# Altium integrated library Supp-Lib.IntLib: 86 symbols (continued)
## SM10B-GHS-TB(LF)(SN) (continued)
GH Disconnectable Crimp Style Connector, Pitch 1.25 mm, 1 x 10 Position, Height 4.25 mm, -25 to 85 degC, RoHS, Tape and Reel; Manufacturer: JST; No of Positions: 10; Pitch: 1.25mm; Style/Orientation: RightAngleHeader/Plug; Package Reference: SM10B-GHS-TB; Type: WiretoBoard; Datasheet URL: http://www.jst-mfg.com/product/pdf/eng/eGH.pdf; Termination: Crimp; Manufacturer URL: http://www.jst.com/home2.html; Mounting Technology: SurfaceMount; Datasheet Version: 05/2016; Package Description: GH Disconnectable Crimp Style Connector, Pitch 1.25 mm, 1 x 10 Position, Height 4.25 mm
footprint JST-SM10B-GHS-TB_V (SMD, 10-Leads, Body 15.75x4.05mm, Pitch 1.25mm)
pins: 1, 2, 3, 4, 5, 6, 7, 8, 9, 10, MP1, MP2

## SM11B-GHS-TB(LF)(SN)
designator P?
GH Disconnectable Crimp Style Connector, Pitch 1.25 mm, 1 x 11 Position, Height 4.25 mm, -25 to 85 degC, RoHS, Tape and Reel; Manufacturer: JST; No of Positions: 11; Pitch: 1.25mm; Style/Orientation: RightAngleHeader/Plug; Package Reference: SM11B-GHS-TB; Type: WiretoBoard; Datasheet URL: http://www.jst-mfg.com/product/pdf/eng/eGH.pdf; Termination: Crimp; Manufacturer URL: http://www.jst.com/home2.html; Mounting Technology: SurfaceMount; Datasheet Version: 05/2016; Package Description: GH Disconnectable Crimp Style Connector, Pitch 1.25 mm, 1 x 11 Position, Height 4.25 mm
footprint JST-SM11B-GHS-TB_V (SMD, 11-Leads, Body 17.00x4.05mm, Pitch 1.25mm)
pins: 1, 2, 3, 4, 5, 6, 7, 8, 9, 10, 11, MP1, MP2

## SM12B-GHS-TB(LF)(SN)
designator P?
GH Disconnectable Crimp Style Connector, Pitch 1.25 mm, 1 x 12 Position, Height 4.25 mm, -25 to 85 degC, RoHS, Tape and Reel; Manufacturer: JST; No of Positions: 12; Pitch: 1.25mm; Style/Orientation: RightAngleHeader/Plug; Package Reference: SM12B-GHS-TB; Type: WiretoBoard; Datasheet URL: http://www.jst-mfg.com/product/pdf/eng/eGH.pdf; Termination: Crimp; Manufacturer URL: http://www.jst.com/home2.html; Mounting Technology: SurfaceMount; Datasheet Version: 05/2016; Package Description: GH Disconnectable Crimp Style Connector, Pitch 1.25 mm, 1 x 12 Position, Height 4.25 mm
footprint JST-SM12B-GHS-TB_V (SMD, 12-Leads, Body 18.25x4.05mm, Pitch 1.25mm)
pins: 1, 2, 3, 4, 5, 6, 7, 8, 9, 10, 11, 12, MP1, MP2

## SM13B-GHS-TB(LF)(SN)
designator P?
GH Disconnectable Crimp Style Connector, Pitch 1.25 mm, 1 x 13 Position, Height 4.25 mm, -25 to 85 degC, RoHS, Tape and Reel; Manufacturer: JST; No of Positions: 13; Pitch: 1.25mm; Style/Orientation: RightAngleHeader/Plug; Package Reference: SM13B-GHS-TB; Type: WiretoBoard; Datasheet URL: http://www.jst-mfg.com/product/pdf/eng/eGH.pdf; Termination: Crimp; Manufacturer URL: http://www.jst.com/home2.html; Mounting Technology: SurfaceMount; Datasheet Version: 05/2016; Package Description: GH Disconnectable Crimp Style Connector, Pitch 1.25 mm, 1 x 13 Position, Height 4.25 mm
footprint JST-SM13B-GHS-TB_V (SMD, 13-Leads, Body 19.50x4.05mm, Pitch 1.25mm)
pins: 1, 2, 3, 4, 5, 6, 7, 8, 9, 10, 11, 12, 13, MP1, MP2

## SM14B-GHS-TB(LF)(SN)
designator P?
GH Disconnectable Crimp Style Connector, Pitch 1.25 mm, 1 x 14 Position, Height 4.25 mm, -25 to 85 degC, RoHS, Tape and Reel; Manufacturer: JST; No of Positions: 14; Pitch: 1.25mm; Style/Orientation: RightAngleHeader/Plug; Package Reference: SM14B-GHS-TB; Type: WiretoBoard; Datasheet URL: http://www.jst-mfg.com/product/pdf/eng/eGH.pdf; Termination: Crimp; Manufacturer URL: http://www.jst.com/home2.html; Mounting Technology: SurfaceMount; Datasheet Version: 05/2016; Package Description: GH Disconnectable Crimp Style Connector, Pitch 1.25 mm, 1 x 14 Position, Height 4.25 mm
footprint JST-SM14B-GHS-TB_V (SMD, 14-Leads, Body 20.75x4.05mm, Pitch 1.25mm)
pins: 1, 2, 3, 4, 5, 6, 7, 8, 9, 10, 11, 12, 13, 14, MP1, MP2

## SM15B-GHS-TB(LF)(SN)
designator P?, comment SM15B-GHS-TBT(LF)(SN)
GH Disconnectable Crimp Style Connector, Pitch 1.25 mm, 1 x 15 Position, Height 4.25 mm, -25 to 85 degC, RoHS, Tape and Reel; Manufacturer: JST; No of Positions: 15; Pitch: 1.25mm; Style/Orientation: RightAngleHeader/Plug; Package Reference: SM15B-GHS-TB; Type: WiretoBoard; Datasheet URL: http://www.jst-mfg.com/product/pdf/eng/eGH.pdf; Termination: Crimp; Manufacturer URL: http://www.jst.com/home2.html; Mounting Technology: SurfaceMount; Datasheet Version: 05/2016; Package Description: GH Disconnectable Crimp Style Connector, Pitch 1.25 mm, 1 x 15 Position, Height 4.25 mm
footprint JST-SM15B-GHS-TB_V (SMD, 15-Leads, Body 22.00x4.05mm, Pitch 1.25mm)
pins: 1, 2, 3, 4, 5, 6, 7, 8, 9, 10, 11, 12, 13, 14, 15, MP1, MP2


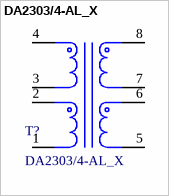
[diagram p8: symbol DA2303/4-AL_X]

## DA2303/4-AL_X
designator T?
SMT Power Transformers
footprint DA2303-AL
pins: 1, 2, 3, 4, 5, 6, 7, 8


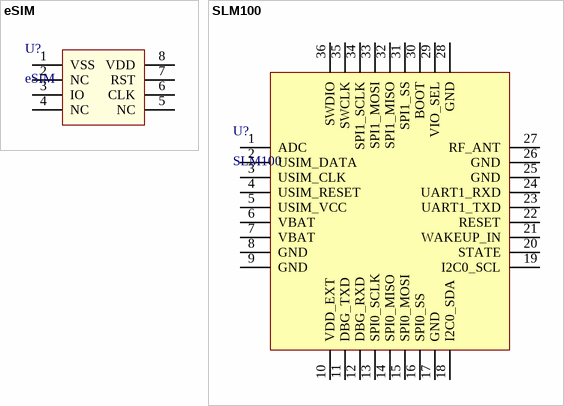
[diagram p9: symbols eSIM to SLM100]

## eSIM
designator U?
中移物联网eSIM 芯片
footprint WSON8_2X2
footprint WSON8_5X6
footprint WSON8_5X6-L
footprint WSON8_5X6-M
pins: 1 VSS, 2 NC, 3 IO, 4 NC, 5 NC, 6 CLK, 7 RST, 8 VDD

## SLM100
designator U?
SLM100 NB-IOT 模块
footprint SLM100
pins: 1 ADC, 2 USIM_DATA, 3 USIM_CLK, 4 USIM_RESET, 5 USIM_VCC, 6 VBAT, 7 VBAT, 8 GND, 9 GND, 10 VDD_EXT, 11 DBG_TXD, 12 DBG_RXD, 13 SPI0_SCLK, 14 SPI0_MISO, 15 SPI0_MOSI, 16 SPI0_SS, 17 GND, 18 I2C0_SDA, 19 I2C0_SCL, 20 STATE, 21 WAKEUP_IN, 22 RESET, 23 UART1_TXD, 24 UART1_RXD, 25 GND, 26 GND, 27 RF_ANT, 28 GND, 29 VIO_SEL, 30 BOOT, 31 SPI1_SS, 32 SPI1_MISO, 33 SPI1_MOSI, 34 SPI1_SCLK, 35 SWCLK, 36 SWDIO


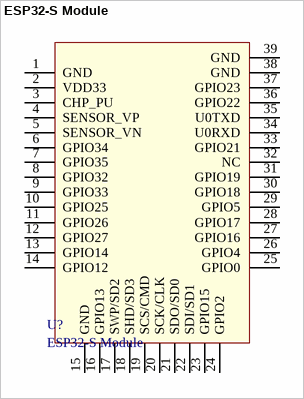
[diagram p10: symbol ESP32-S Module]

## ESP32-S Module
designator U?
通用型 WiFi-BT-BLE MCU 模组
footprint ESP32-S
pins: 1 GND, 2 VDD33, 3 CHP_PU, 4 SENSOR_VP, 5 SENSOR_VN, 6 GPIO34, 7 GPIO35, 8 GPIO32, 9 GPIO33, 10 GPIO25, 11 GPIO26, 12 GPIO27, 13 GPIO14, 14 GPIO12, 15 GND, 16 GPIO13, 17 SWP/SD2, 18 SHD/SD3, 19 SCS/CMD, 20 SCK/CLK, 21 SDO/SD0, 22 SDI/SD1, 23 GPIO15, 24 GPIO2, 25 GPIO0, 26 GPIO4, 27 GPIO16, 28 GPIO17, 29 GPIO5, 30 GPIO18, 31 GPIO19, 32 NC, 33 GPIO21, 34 U0RXD, 35 U0TXD, 36 GPIO22, 37 GPIO23, 38 GND, 39 GND


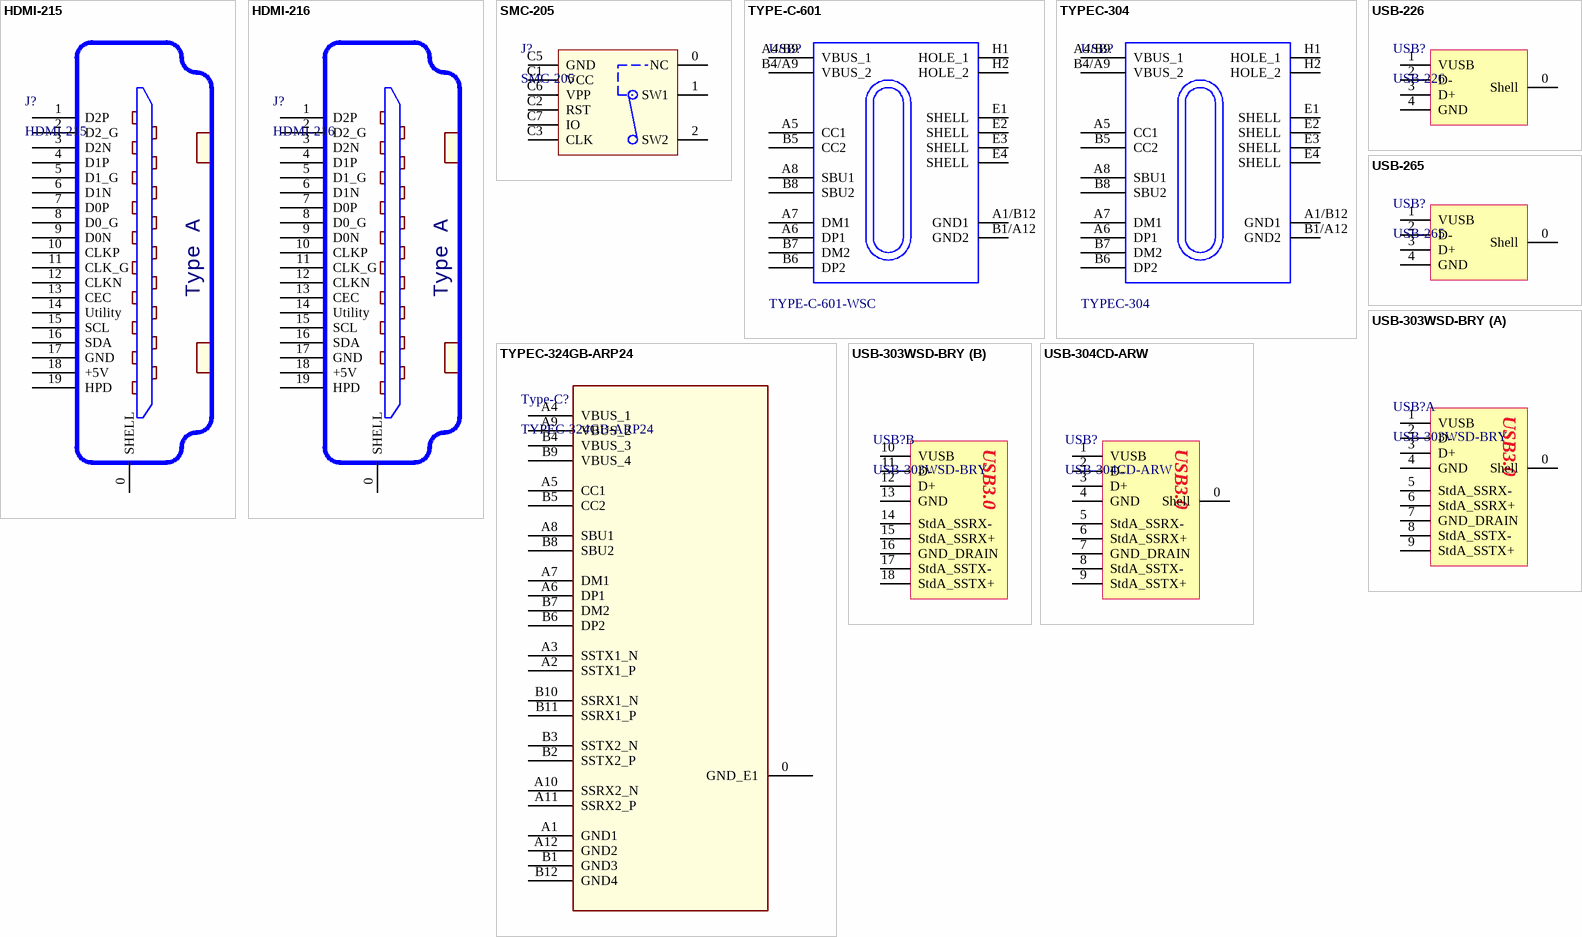
[diagram p11: symbols HDMI-215 to USB-304CD-ARW]

## HDMI-215
designator J?
讯普HDMI-215连接器
footprint HDMI-215
pins: 0 SHELL, 1 D2P, 2 D2_G, 3 D2N, 4 D1P, 5 D1_G, 6 D1N, 7 D0P, 8 D0_G, 9 D0N, 10 CLKP, 11 CLK_G, 12 CLKN, 13 CEC, 14 Utility, 15 SCL, 16 SDA, 17 GND, 18 +5V, 19 HPD
text: Type A

## HDMI-216
designator J?
讯普HDMI-216连接器
footprint HDMI-216
pins: 0 SHELL, 1 D2P, 2 D2_G, 3 D2N, 4 D1P, 5 D1_G, 6 D1N, 7 D0P, 8 D0_G, 9 D0N, 10 CLKP, 11 CLK_G, 12 CLKN, 13 CEC, 14 Utility, 15 SCL, 16 SDA, 17 GND, 18 +5V, 19 HPD
text: Type A

## SMC-205
designator J?
自弹式 带检测PIN MICRO SIM; Revised By: Z_xiao
footprint SMC-205
pins: 0 NC, 1 SW1, 2 SW2, C1 VCC, C2 RST, C3 CLK, C5 GND, C6 VPP, C7 IO

## TYPE-C-601
designator USB?, comment TYPE-C-601-WSC
16PIN(带2.0数据版) 卧式贴片型母座; Value: TYPE-C; 存货编码: 1120102031; 存货名称: 贴装USB座; 规格型号: USB2.0,type-c,母座,单层,横卧,16pin,（两脚为插装）
footprint TYPE-C-601-WSC
footprint TYPE-C-601-WSCL100
pins: A1/B12 GND1, A4/B9 VBUS_1, A5 CC1, A6 DP1, A7 DM1, A8 SBU1, B1/A12 GND2, B4/A9 VBUS_2, B5 CC2, B6 DP2, B7 DM2, B8 SBU2, E1 SHELL, E2 SHELL, E3 SHELL, E4 SHELL, H1 HOLE_1, H2 HOLE_2

## TYPEC-304
designator USB?
16PIN(带2.0数据版) 卧式贴片型母座; Value: TYPE-C; 存货编码: 1120102031; 存货名称: 贴装USB座; 规格型号: USB2.0,type-c,母座,单层,横卧,16pin,（两脚为插装）
footprint TYPEC-304-ACP16
pins: A1/B12 GND1, A4/B9 VBUS_1, A5 CC1, A6 DP1, A7 DM1, A8 SBU1, B1/A12 GND2, B4/A9 VBUS_2, B5 CC2, B6 DP2, B7 DM2, B8 SBU2, E1 SHELL, E2 SHELL, E3 SHELL, E4 SHELL, H1 HOLE_1, H2 HOLE_2

## TYPEC-324GB-ARP24
designator Type-C?
24PIN(全功能版)  母座  卧式 贴片型
footprint TYPEC-324GB-ARP24
pins: 0 GND_E1, A1 GND1, A2 SSTX1_P, A3 SSTX1_N, A4 VBUS_1, A5 CC1, A6 DP1, A7 DM1, A8 SBU1, A9 VBUS_2, A10 SSRX2_N, A11 SSRX2_P, A12 GND2, B1 GND3, B2 SSTX2_P, B3 SSTX2_N, B4 VBUS_3, B5 CC2, B6 DP2, B7 DM2, B8 SBU2, B9 VBUS_4, B10 SSRX1_N, B11 SSRX1_P, B12 GND4

## USB-226
designator USB?
USB2.0 侧立 母座 插脚型
footprint USB-226-BRW
pins: 0 Shell, 1 VUSB, 2 D-, 3 D+, 4 GND

## USB-265
designator USB?
USB2.0 侧立 母座 插脚型
footprint USB-265-BRW
pins: 0 Shell, 1 VUSB, 2 D-, 3 D+, 4 GND

## USB-303WSD-BRY
designator USB?
9pin 双排 卧插 卷边/无卷边 A型母座
footprint USB-303WSD-CRY
footprint USB-303WSD-BRY
footprint USB-303WSD-BRW
part A pins: 0 Shell, 1 VUSB, 2 D-, 3 D+, 4 GND, 5 StdA_SSRX-, 6 StdA_SSRX+, 7 GND_DRAIN, 8 StdA_SSTX-, 9 StdA_SSTX+
part B pins: 10 VUSB, 11 D-, 12 D+, 13 GND, 14 StdA_SSRX-, 15 StdA_SSRX+, 16 GND_DRAIN, 17 StdA_SSTX-, 18 StdA_SSTX+
part A text: USB3.0
part B text: USB3.0

## USB-304CD-ARW
designator USB?
USB3.0 侧立 母座 插脚型
footprint USB-304CD-ARW
pins: 0 Shell, 1 VUSB, 2 D-, 3 D+, 4 GND, 5 StdA_SSRX-, 6 StdA_SSRX+, 7 GND_DRAIN, 8 StdA_SSTX-, 9 StdA_SSTX+
text: USB3.0


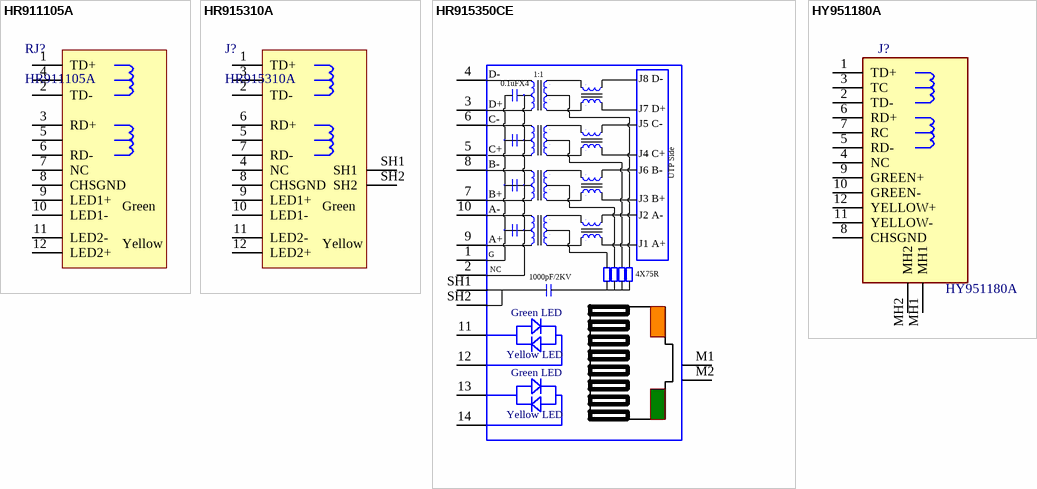
[diagram p12: symbols HR911105A to HY951180A]

## HR911105A
designator RJ?
带灯以太网接口; Revised By: Z_xiao; Datasheet: http://www.hanrun.com/public/upload/down/2020/09-11/cc11be56d66bb63d5f1eeb85492439c0.pdf
footprint HR911105A (网线接口)
pins: 1 TD+, 2 TD-, 3 RD+, 4, 5, 6 RD-, 7 NC, 8 CHSGND, 9 LED1+, 10 LED1-, 11 LED2-, 12 LED2+
text: Green; Yellow

## HR915310A
designator J?
1x1 Port Tab upright RJ45 Connectorwith Integrated Magnetics and LEDfor 10/100Base-TX NIC Applications; Manufacturer_Name: Hanrun Electronics; Description: RJ45Receptacle 1 Shielded Direct Insert WithLED 0~+70 Plugin Ethernet Connectors / Modular Connectors (RJ45 RJ11) ROHS; Datasheet Link: https://www.lcsc.com/datasheet/lcsc_datasheet_2411121057_HANRUN-Zhongshan-HanRun-Elec-HR915310A_C2760326.pdf; Height: 17.15mm; Manufacturer_Part_Number: hr915310a
footprint hr915310a
pins: 1 TD+, 2 TD-, 3, 4 NC, 5, 6 RD+, 7 RD-, 8 CHSGND, 9 LED1+, 10 LED1-, 11 LED2-, 12 LED2+, SH1, SH2
text: Green; Yellow

## HR915350CE
designator HR915350CE
1x1Port Tab-UP RJ45 Connector / with Integrated Magnetics and LED / for 10/100/1000Base-T Applications; Revised By: Z_xiao; ComponentLink1Description: Datasheet; ComponentLink1URL: http://www.hanrun.com/index.php
footprint HR915350CE
pins: 1 GND, 2 NC, 3 D+, 4 D-, 5 C+, 6 C-, 7 B+, 8 B-, 9 A+, 10 A-, 11, 12, 13, 14, M1, M2, SH1, SH2
text: 1:1; 0.1uFX4; J8 D-; J7 D+; J5 C-; J4 C+; J6 B-; UTP Side; J3 B+; J2 A-; J1 A+; G; 1000pF/2KV; 4X75R; Green LED; Yellow LED

## HY951180A
designator J?
1x1 Port Tab upright RJ45 Connector / with Integrated Magnetics and LED / for 10/100Base-TX NIC Applications; Manufacturer_Name: Hanrun Electronics; Datasheet Link: https://datasheet.lcsc.com/szlcsc/Zhongshan-HanRun-Elec-HY951180A_C34677.pdf; Height: 17.5mm; Manufacturer_Part_Number: HY951180A
footprint HY951180A
pins: 1 TD+, 2 TD-, 3 TC, 4 NC, 5 RD-, 6 RD+, 7 RC, 8 CHSGND, 9 GREEN+, 10 GREEN-, 11 YELLOW-, 12 YELLOW+, MH1, MH2


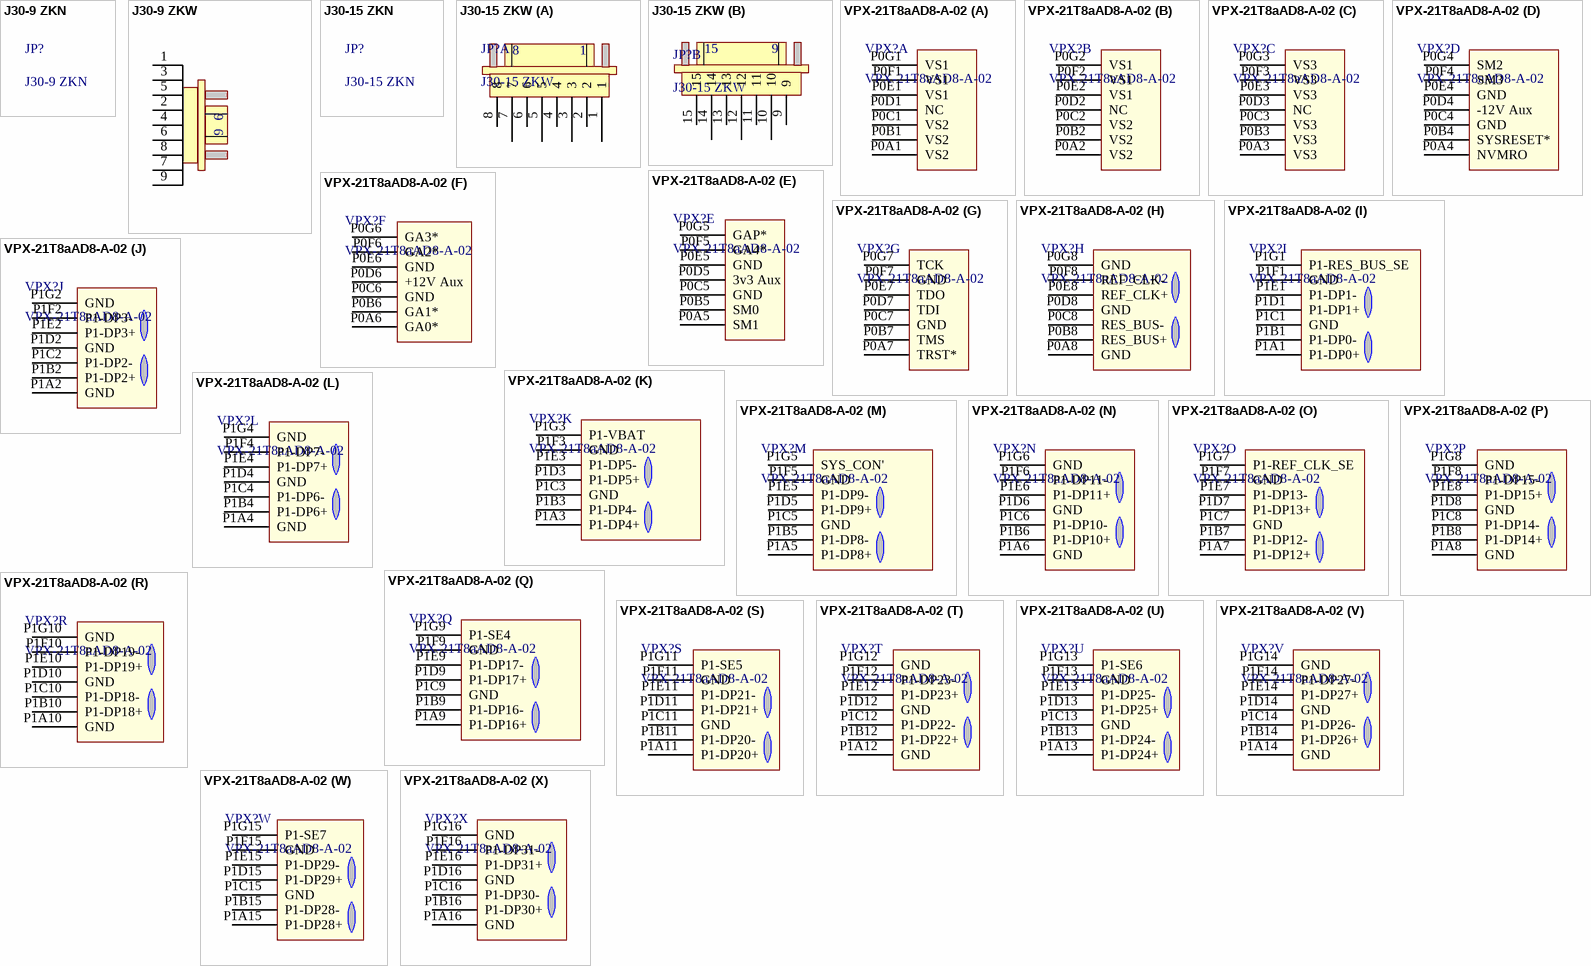
[diagram p13: symbols J30-9 ZKN to VPX-21T8aAD8-A-02]

## J30-9 ZKN
designator JP?
J30、J30G直插印制板N型; Revised By: Z_xiao; ComponentLink1Description: Datasheet; ComponentLink1URL: https://newwezhanoss.oss-cn-hangzhou.aliyuncs.com/contents/sitefiles2022/10113390/files/259706..pdf?Expires=1654738659&OSSAccessKeyId=LTAIekGM1705vEQp&Signature=t6hiNJjp8JnK%2F00JWUBUhsjD5Xc%3D&response-content-disposition=inline%3Bfilename%3DJ30J%25e8%25b5%2584%25e6%2596%2599.pdf&response-content-type=application%2Fpdf

## J30-9 ZKW
designator JP?
J30、J30G 弯插印制板W型; Revised By: Z_xiao; ComponentLink1Description: Datasheet; ComponentLink1URL: https://newwezhanoss.oss-cn-hangzhou.aliyuncs.com/contents/sitefiles2022/10113390/files/259706..pdf?Expires=1654738659&OSSAccessKeyId=LTAIekGM1705vEQp&Signature=t6hiNJjp8JnK%2F00JWUBUhsjD5Xc%3D&response-content-disposition=inline%3Bfilename%3DJ30J%25e8%25b5%2584%25e6%2596%2599.pdf&response-content-type=application%2Fpdf
footprint J30-9ZKW
pins: 1, 2, 3, 4, 5, 6, 7, 8, 9

## J30-15 ZKN
designator JP?
J30、J30G直插印制板N型; Revised By: Z_xiao; ComponentLink1Description: Datasheet; ComponentLink1URL: https://newwezhanoss.oss-cn-hangzhou.aliyuncs.com/contents/sitefiles2022/10113390/files/259706..pdf?Expires=1654738659&OSSAccessKeyId=LTAIekGM1705vEQp&Signature=t6hiNJjp8JnK%2F00JWUBUhsjD5Xc%3D&response-content-disposition=inline%3Bfilename%3DJ30J%25e8%25b5%2584%25e6%2596%2599.pdf&response-content-type=application%2Fpdf

## J30-15 ZKW
designator JP?
J30、J30G 弯插印制板W型; Revised By: Z_xiao; ComponentLink1Description: Datasheet; ComponentLink1URL: https://newwezhanoss.oss-cn-hangzhou.aliyuncs.com/contents/sitefiles2022/10113390/files/259706..pdf?Expires=1654738659&OSSAccessKeyId=LTAIekGM1705vEQp&Signature=t6hiNJjp8JnK%2F00JWUBUhsjD5Xc%3D&response-content-disposition=inline%3Bfilename%3DJ30J%25e8%25b5%2584%25e6%2596%2599.pdf&response-content-type=application%2Fpdf
footprint J30-15ZKW (弯座)
part A pins: 1, 2, 3, 4, 5, 6, 7, 8
part B pins: 9, 10, 11, 12, 13, 14, 15

## VPX-21T8aAD8-A-02
designator VPX?
VPX 系列模块化加固型混装连接器
footprint VPX-21T8aAD8-A-02
part A pins: P0A1 VS2, P0B1 VS2, P0C1 VS2, P0D1 NC, P0E1 VS1, P0F1 VS1, P0G1 VS1
part B pins: P0A2 VS2, P0B2 VS2, P0C2 VS2, P0D2 NC, P0E2 VS1, P0F2 VS1, P0G2 VS1
part C pins: P0A3 VS3, P0B3 VS3, P0C3 VS3, P0D3 NC, P0E3 VS3, P0F3 VS3, P0G3 VS3
part D pins: P0A4 NVMRO, P0B4 SYSRESET*, P0C4 GND, P0D4 -12V Aux, P0E4 GND, P0F4 SM3, P0G4 SM2
part E pins: P0A5 SM1, P0B5 SM0, P0C5 GND, P0D5 3v3 Aux, P0E5 GND, P0F5 GA4*, P0G5 GAP*
part F pins: P0A6 GA0*, P0B6 GA1*, P0C6 GND, P0D6 +12V Aux, P0E6 GND, P0F6 GA2*, P0G6 GA3*
part G pins: P0A7 TRST*, P0B7 TMS, P0C7 GND, P0D7 TDI, P0E7 TDO, P0F7 GND, P0G7 TCK
part H pins: P0A8 GND, P0B8 RES_BUS+, P0C8 RES_BUS-, P0D8 GND, P0E8 REF_CLK+, P0F8 REF_CLK-, P0G8 GND
part I pins: P1A1 P1-DP0+, P1B1 P1-DP0-, P1C1 GND, P1D1 P1-DP1+, P1E1 P1-DP1-, P1F1 GND, P1G1 P1-RES_BUS_SE
part J pins: P1A2 GND, P1B2 P1-DP2+, P1C2 P1-DP2-, P1D2 GND, P1E2 P1-DP3+, P1F2 P1-DP3-, P1G2 GND
part K pins: P1A3 P1-DP4+, P1B3 P1-DP4-, P1C3 GND, P1D3 P1-DP5+, P1E3 P1-DP5-, P1F3 GND, P1G3 P1-VBAT
part L pins: P1A4 GND, P1B4 P1-DP6+, P1C4 P1-DP6-, P1D4 GND, P1E4 P1-DP7+, P1F4 P1-DP7-, P1G4 GND
part M pins: P1A5 P1-DP8+, P1B5 P1-DP8-, P1C5 GND, P1D5 P1-DP9+, P1E5 P1-DP9-, P1F5 GND, P1G5 SYS_CON'
part N pins: P1A6 GND, P1B6 P1-DP10+, P1C6 P1-DP10-, P1D6 GND, P1E6 P1-DP11+, P1F6 P1-DP11-, P1G6 GND
part O pins: P1A7 P1-DP12+, P1B7 P1-DP12-, P1C7 GND, P1D7 P1-DP13+, P1E7 P1-DP13-, P1F7 GND, P1G7 P1-REF_CLK_SE
part P pins: P1A8 GND, P1B8 P1-DP14+, P1C8 P1-DP14-, P1D8 GND, P1E8 P1-DP15+, P1F8 P1-DP15-, P1G8 GND
part Q pins: P1A9 P1-DP16+, P1B9 P1-DP16-, P1C9 GND, P1D9 P1-DP17+, P1E9 P1-DP17-, P1F9 GND, P1G9 P1-SE4
part R pins: P1A10 GND, P1B10 P1-DP18+, P1C10 P1-DP18-, P1D10 GND, P1E10 P1-DP19+, P1F10 P1-DP19-, P1G10 GND
part S pins: P1A11 P1-DP20+, P1B11 P1-DP20-, P1C11 GND, P1D11 P1-DP21+, P1E11 P1-DP21-, P1F11 GND, P1G11 P1-SE5
part T pins: P1A12 GND, P1B12 P1-DP22+, P1C12 P1-DP22-, P1D12 GND, P1E12 P1-DP23+, P1F12 P1-DP23-, P1G12 GND
part U pins: P1A13 P1-DP24+, P1B13 P1-DP24-, P1C13 GND, P1D13 P1-DP25+, P1E13 P1-DP25-, P1F13 GND, P1G13 P1-SE6
part V pins: P1A14 GND, P1B14 P1-DP26+, P1C14 P1-DP26-, P1D14 GND, P1E14 P1-DP27+, P1F14 P1-DP27-, P1G14 GND
part W pins: P1A15 P1-DP28+, P1B15 P1-DP28-, P1C15 GND, P1D15 P1-DP29+, P1E15 P1-DP29-, P1F15 GND, P1G15 P1-SE7
part X pins: P1A16 GND, P1B16 P1-DP30+, P1C16 P1-DP30-, P1D16 GND, P1E16 P1-DP31+, P1F16 P1-DP31-, P1G16 GND


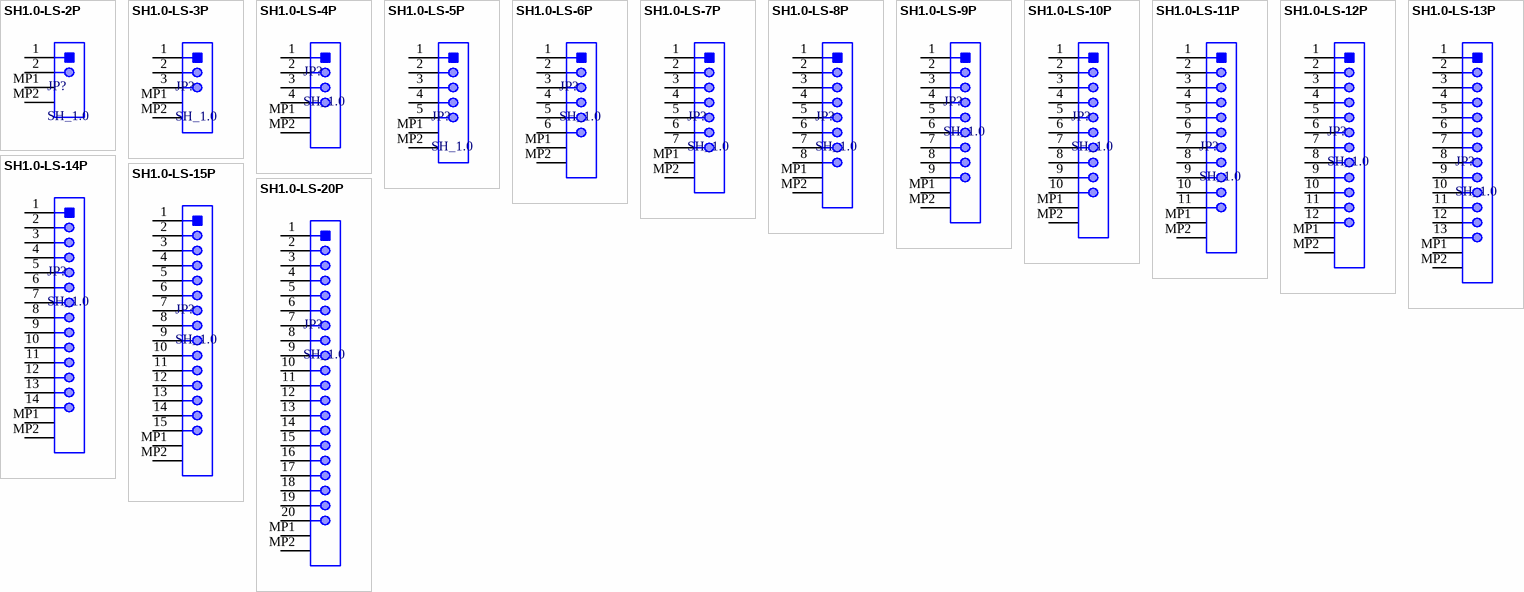
[diagram p14: symbols SH1.0-LS-2P to SH1.0-LS-20P]

## SH1.0-LS-2P
designator JP?, comment SH_1.0
SH CONNECTOR 1.0 mm pitch/Disconnectable Crimp style connectors 1 x 2 Position
footprint SH1.0-LS-2P
footprint SH1.0-WS-2P
pins: 1, 2, MP1, MP2

## SH1.0-LS-3P
designator JP?, comment SH_1.0
SH CONNECTOR 1.0 mm pitch/Disconnectable Crimp style connectors 1 x 3 Position
footprint SH1.0-LS-3P
footprint SH1.0-WS-3P
pins: 1, 2, 3, MP1, MP2

## SH1.0-LS-4P
designator JP?, comment SH_1.0
SH CONNECTOR 1.0 mm pitch/Disconnectable Crimp style connectors 1 x 4 Position
footprint SH1.0-LS-4P
footprint SH1.0-WS-4P
pins: 1, 2, 3, 4, MP1, MP2

## SH1.0-LS-5P
designator JP?, comment SH_1.0
SH CONNECTOR 1.0 mm pitch/Disconnectable Crimp style connectors 1 x 5 Position
footprint SH1.0-LS-5P
footprint SH1.0-WS-5P
pins: 1, 2, 3, 4, 5, MP1, MP2

## SH1.0-LS-6P
designator JP?, comment SH_1.0
SH CONNECTOR 1.0 mm pitch/Disconnectable Crimp style connectors 1 x 6 Position
footprint SH1.0-LS-6P
footprint SH1.0-WS-6P
pins: 1, 2, 3, 4, 5, 6, MP1, MP2

## SH1.0-LS-7P
designator JP?, comment SH_1.0
SH CONNECTOR 1.0 mm pitch/Disconnectable Crimp style connectors 1 x 7 Position
footprint SH1.0-LS-7P
footprint SH1.0-WS-7P
pins: 1, 2, 3, 4, 5, 6, 7, MP1, MP2

## SH1.0-LS-8P
designator JP?, comment SH_1.0
SH CONNECTOR 1.0 mm pitch/Disconnectable Crimp style connectors 1 x 8 Position
footprint SH1.0-LS-8P
footprint SH1.0-WS-8P
pins: 1, 2, 3, 4, 5, 6, 7, 8, MP1, MP2

## SH1.0-LS-9P
designator JP?, comment SH_1.0
SH CONNECTOR 1.0 mm pitch/Disconnectable Crimp style connectors 1 x 9 Position
footprint SH1.0-LS-9P
footprint SH1.0-WS-9P
pins: 1, 2, 3, 4, 5, 6, 7, 8, 9, MP1, MP2

## SH1.0-LS-10P
designator JP?, comment SH_1.0
SH CONNECTOR 1.0 mm pitch/Disconnectable Crimp style connectors 1 x 10 Position
footprint SH1.0-LS-10P
footprint SH1.0-WS-10P
pins: 1, 2, 3, 4, 5, 6, 7, 8, 9, 10, MP1, MP2

## SH1.0-LS-11P
designator JP?, comment SH_1.0
SH CONNECTOR 1.0 mm pitch/Disconnectable Crimp style connectors 1 x 11 Position
footprint SH1.0-LS-11P
footprint SH1.0-WS-11P
pins: 1, 2, 3, 4, 5, 6, 7, 8, 9, 10, 11, MP1, MP2

## SH1.0-LS-12P
designator JP?, comment SH_1.0
SH CONNECTOR 1.0 mm pitch/Disconnectable Crimp style connectors 1 x 12 Position
footprint SH1.0-WS-12P
footprint SH1.0-LS-12P
pins: 1, 2, 3, 4, 5, 6, 7, 8, 9, 10, 11, 12, MP1, MP2

## SH1.0-LS-13P
designator JP?, comment SH_1.0
SH CONNECTOR 1.0 mm pitch/Disconnectable Crimp style connectors 1 x 13 Position
footprint SH1.0-LS-13P
footprint SH1.0-WS-13P
pins: 1, 2, 3, 4, 5, 6, 7, 8, 9, 10, 11, 12, 13, MP1, MP2

## SH1.0-LS-14P
designator JP?, comment SH_1.0
SH CONNECTOR 1.0 mm pitch/Disconnectable Crimp style connectors 1 x 14 Position
footprint SH1.0-LS-14P
footprint SH1.0-WS-14P
pins: 1, 2, 3, 4, 5, 6, 7, 8, 9, 10, 11, 12, 13, 14, MP1, MP2

## SH1.0-LS-15P
designator JP?, comment SH_1.0
SH CONNECTOR 1.0 mm pitch/Disconnectable Crimp style connectors 1 x 15 Position
footprint SH1.0-LS-15P
footprint SH1.0-WS-15P
pins: 1, 2, 3, 4, 5, 6, 7, 8, 9, 10, 11, 12, 13, 14, 15, MP1, MP2

## SH1.0-LS-20P
designator JP?, comment SH_1.0
SH CONNECTOR 1.0 mm pitch/Disconnectable Crimp style connectors 1 x 20 Position
footprint SH1.0-LS-20P
pins: 1, 2, 3, 4, 5, 6, 7, 8, 9, 10, 11, 12, 13, 14, 15, 16, 17, 18, 19, 20, MP1, MP2


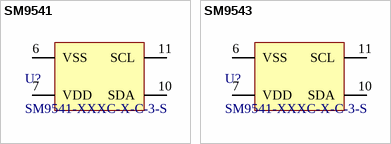
[diagram p15: symbols SM9541 to SM9543]

## SM9541
designator U?, comment SM9541-XXXC-X-C-3-S
footprint SM9541_L (10.3*10.3*2.6mm（长宽高）)
footprint SM9541_M (10.3*10.3*2.6mm（长宽高）)
footprint SM9541_N (10.3*10.3*2.6mm（长宽高）)
pins: 6 VSS, 7 VDD, 10 SDA, 11 SCL

## SM9543
designator U?, comment SM9541-XXXC-X-C-3-S
footprint SM9541_L (10.3*10.3*2.6mm（长宽高）)
footprint SM9541_M (10.3*10.3*2.6mm（长宽高）)
footprint SM9541_N (10.3*10.3*2.6mm（长宽高）)
pins: 6 VSS, 7 VDD, 10 SDA, 11 SCL


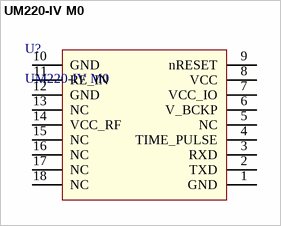
[diagram p16: symbol UM220-IV M0]

## UM220-IV M0
designator U?
工规级多系统GNSS导航定位模组; Revised By: Z_xiao
footprint UM220-IV-M0
pins: 1 GND, 2 TXD, 3 RXD, 4 TIME_PULSE, 5 NC, 6 V_BCKP, 7 VCC_IO, 8 VCC, 9 nRESET, 10 GND, 11 RE_IN, 12 GND, 13 NC, 14 VCC_RF, 15 NC, 16 NC, 17 NC, 18 NC